# Altium footprint library ref-packages.PCBLIB: 1543 footprints (part 72 of 103) (continued)
## SQFP-R-10X14-140 [mm] (continued)
  rectangle: 6.95,0.68 8.1,0.82
  rectangle: 6.95,0.98 8.1,1.12
  rectangle: 6.95,1.28 8.1,1.42
  rectangle: 6.95,1.58 8.1,1.72
  rectangle: 6.95,1.88 8.1,2.02
  rectangle: 6.95,2.18 8.1,2.32
  rectangle: 6.95,2.48 8.1,2.62
  rectangle: 6.95,2.78 8.1,2.92
  rectangle: 6.95,3.08 8.1,3.22
  rectangle: 6.95,3.38 8.1,3.52
  rectangle: 6.95,3.68 8.1,3.82
  rectangle: 6.95,3.98 8.1,4.12
  rectangle: 6.08,4.95 6.22,6.1
  rectangle: 5.78,4.95 5.92,6.1
  rectangle: 5.48,4.95 5.62,6.1
  rectangle: 5.18,4.95 5.32,6.1
  rectangle: 4.88,4.95 5.02,6.1
  rectangle: 4.58,4.95 4.72,6.1
  rectangle: 4.28,4.95 4.42,6.1
  rectangle: 3.98,4.95 4.12,6.1
  rectangle: 3.68,4.95 3.82,6.1
  rectangle: 3.38,4.95 3.52,6.1
  rectangle: 3.08,4.95 3.22,6.1
  rectangle: 2.78,4.95 2.92,6.1
  rectangle: 2.48,4.95 2.62,6.1
  rectangle: 2.18,4.95 2.32,6.1
  rectangle: 1.88,4.95 2.02,6.1
  rectangle: 1.58,4.95 1.72,6.1
  rectangle: 1.28,4.95 1.42,6.1
  rectangle: 0.98,4.95 1.12,6.1
  rectangle: 0.68,4.95 0.82,6.1
  rectangle: 0.38,4.95 0.52,6.1
  rectangle: 0.08,4.95 0.22,6.1
  rectangle: -0.22,4.95 -0.08,6.1
  rectangle: -0.52,4.95 -0.38,6.1
  rectangle: -0.82,4.95 -0.68,6.1
  rectangle: -1.12,4.95 -0.98,6.1
  rectangle: -1.42,4.95 -1.28,6.1
  rectangle: -1.72,4.95 -1.58,6.1
  rectangle: -2.02,4.95 -1.88,6.1
  rectangle: -2.32,4.95 -2.18,6.1
  rectangle: -2.62,4.95 -2.48,6.1
  rectangle: -2.92,4.95 -2.78,6.1
  rectangle: -3.22,4.95 -3.08,6.1
  rectangle: -3.52,4.95 -3.38,6.1
  rectangle: -3.82,4.95 -3.68,6.1
  rectangle: -4.12,4.95 -3.98,6.1
  rectangle: -4.42,4.95 -4.28,6.1
  rectangle: -4.72,4.95 -4.58,6.1
  rectangle: -5.02,4.95 -4.88,6.1
  rectangle: -5.32,4.95 -5.18,6.1
  rectangle: -5.62,4.95 -5.48,6.1
  rectangle: -5.92,4.95 -5.78,6.1
  rectangle: -6.22,4.95 -6.08,6.1
  rectangle: -8.1,3.98 -6.95,4.12
  rectangle: -8.1,3.68 -6.95,3.82
  rectangle: -8.1,3.38 -6.95,3.52
  rectangle: -8.1,3.08 -6.95,3.22
  rectangle: -8.1,2.78 -6.95,2.92
  rectangle: -8.1,2.48 -6.95,2.62
  rectangle: -8.1,2.18 -6.95,2.32
  rectangle: -8.1,1.88 -6.95,2.02
  rectangle: -8.1,1.58 -6.95,1.72
  rectangle: -8.1,1.28 -6.95,1.42
  rectangle: -8.1,0.98 -6.95,1.12
  rectangle: -8.1,0.68 -6.95,0.82
  rectangle: -8.1,0.38 -6.95,0.52
  rectangle: -8.1,0.08 -6.95,0.22
  rectangle: -8.1,-0.22 -6.95,-0.08
  rectangle: -8.1,-0.52 -6.95,-0.38
  rectangle: -8.1,-0.82 -6.95,-0.68
  rectangle: -8.1,-1.12 -6.95,-0.98
  rectangle: -8.1,-1.42 -6.95,-1.28
  rectangle: -8.1,-1.72 -6.95,-1.58
  rectangle: -8.1,-2.02 -6.95,-1.88
  rectangle: -8.1,-2.32 -6.95,-2.18
  rectangle: -8.1,-2.62 -6.95,-2.48
  rectangle: -8.1,-2.92 -6.95,-2.78
  rectangle: -8.1,-3.22 -6.95,-3.08
  rectangle: -8.1,-3.52 -6.95,-3.38
  rectangle: -8.1,-3.82 -6.95,-3.68
  rectangle: -8.1,-4.12 -6.95,-3.98
  lines w0.203: -6.9,-4.9 6.9,-4.9 6.9,4.9 -6.9,4.9 -6.9,-4.9
Mechanical 27:
  lines w0.2: -8.9,-6.9 -8.9,6.9 8.9,6.9 8.9,-6.9 -8.9,-6.9

## SQFP-R-10X14-148 [mm]
pads (148):
  rect 0.17x1.6 smd: 1(-6.45,-5.6) 2(-6.15,-5.6) 3(-5.85,-5.6) 4(-5.55,-5.6) 5(-5.25,-5.6) 6(-4.95,-5.6) 7(-4.65,-5.6) 8(-4.35,-5.6) 9(-4.05,-5.6) 10(-3.75,-5.6) 11(-3.45,-5.6) 12(-3.15,-5.6) 13(-2.85,-5.6) 14(-2.55,-5.6) 15(-2.25,-5.6) 16(-1.95,-5.6) 17(-1.65,-5.6) 18(-1.35,-5.6) 19(-1.05,-5.6) 20(-0.75,-5.6) 21(-0.45,-5.6) 22(-0.15,-5.6) 23(0.15,-5.6) 24(0.45,-5.6) 25(0.75,-5.6) 26(1.05,-5.6) 27(1.35,-5.6) 28(1.65,-5.6) 29(1.95,-5.6) 30(2.25,-5.6) 31(2.55,-5.6) 32(2.85,-5.6) 33(3.15,-5.6) 34(3.45,-5.6) 35(3.75,-5.6) 36(4.05,-5.6) 37(4.35,-5.6) 38(4.65,-5.6) 39(4.95,-5.6) 40(5.25,-5.6) 41(5.55,-5.6) 42(5.85,-5.6) 43(6.15,-5.6) 44(6.45,-5.6) 75(6.45,5.6) 76(6.15,5.6) 77(5.85,5.6) 78(5.55,5.6) 79(5.25,5.6) 80(4.95,5.6) 81(4.65,5.6) 82(4.35,5.6) 83(4.05,5.6) 84(3.75,5.6) 85(3.45,5.6) 86(3.15,5.6) 87(2.85,5.6) 88(2.55,5.6) 89(2.25,5.6) 90(1.95,5.6) 91(1.65,5.6) 92(1.35,5.6) 93(1.05,5.6) 94(0.75,5.6) 95(0.45,5.6) 96(0.15,5.6) 97(-0.15,5.6) 98(-0.45,5.6) 99(-0.75,5.6) 100(-1.05,5.6) 101(-1.35,5.6) 102(-1.65,5.6) 103(-1.95,5.6) 104(-2.25,5.6) 105(-2.55,5.6) 106(-2.85,5.6) 107(-3.15,5.6) 108(-3.45,5.6) 109(-3.75,5.6) 110(-4.05,5.6) 111(-4.35,5.6) 112(-4.65,5.6) 113(-4.95,5.6) 114(-5.25,5.6) 115(-5.55,5.6) 116(-5.85,5.6) 117(-6.15,5.6) 118(-6.45,5.6)
  rect 1.6x0.17 smd: 45(7.6,-4.35) 46(7.6,-4.05) 47(7.6,-3.75) 48(7.6,-3.45) 49(7.6,-3.15) 50(7.6,-2.85) 51(7.6,-2.55) 52(7.6,-2.25) 53(7.6,-1.95) 54(7.6,-1.65) 55(7.6,-1.35) 56(7.6,-1.05) 57(7.6,-0.75) 58(7.6,-0.45) 59(7.6,-0.15) 60(7.6,0.15) 61(7.6,0.45) 62(7.6,0.75) 63(7.6,1.05) 64(7.6,1.35) 65(7.6,1.65) 66(7.6,1.95) 67(7.6,2.25) 68(7.6,2.55) 69(7.6,2.85) 70(7.6,3.15) 71(7.6,3.45) 72(7.6,3.75) 73(7.6,4.05) 74(7.6,4.35) 119(-7.6,4.35) 120(-7.6,4.05) 121(-7.6,3.75) 122(-7.6,3.45) 123(-7.6,3.15) 124(-7.6,2.85) 125(-7.6,2.55) 126(-7.6,2.25) 127(-7.6,1.95) 128(-7.6,1.65) 129(-7.6,1.35) 130(-7.6,1.05) 131(-7.6,0.75) 132(-7.6,0.45) 133(-7.6,0.15) 134(-7.6,-0.15) 135(-7.6,-0.45) 136(-7.6,-0.75) 137(-7.6,-1.05) 138(-7.6,-1.35) 139(-7.6,-1.65) 140(-7.6,-1.95) 141(-7.6,-2.25) 142(-7.6,-2.55) 143(-7.6,-2.85) 144(-7.6,-3.15) 145(-7.6,-3.45) 146(-7.6,-3.75) 147(-7.6,-4.05) 148(-7.6,-4.35)
Top Overlay:
  circle w0.254: c-5.5,-3.5 r0.75
  lines w0.203: -6.57,-4.56 6.56,-4.56 6.56,4.56 -6.57,4.56 -6.57,-4.56
Mechanical 16:
  drawing of 152 lines, arcs and shapes, not listed
Mechanical 27:
  lines w0.2: -8.9,-6.9 -8.9,6.9 8.9,6.9 8.9,-6.9 -8.9,-6.9

## SQFP-R-14X20-80 [mm]
pads (80):
  rect 0.5x1.8 smd: 1(-9.2,-8.1) 2(-8.4,-8.1) 3(-7.6,-8.1) 4(-6.8,-8.1) 5(-6,-8.1) 6(-5.2,-8.1) 7(-4.4,-8.1) 8(-3.6,-8.1) 9(-2.8,-8.1) 10(-2,-8.1) 11(-1.2,-8.1) 12(-0.4,-8.1) 13(0.4,-8.1) 14(1.2,-8.1) 15(2,-8.1) 16(2.8,-8.1) 17(3.6,-8.1) 18(4.4,-8.1) 19(5.2,-8.1) 20(6,-8.1) 21(6.8,-8.1) 22(7.6,-8.1) 23(8.4,-8.1) 24(9.2,-8.1) 41(9.2,8.1) 42(8.4,8.1) 43(7.6,8.1) 44(6.8,8.1) 45(6,8.1) 46(5.2,8.1) 47(4.4,8.1) 48(3.6,8.1) 49(2.8,8.1) 50(2,8.1) 51(1.2,8.1) 52(0.4,8.1) 53(-0.4,8.1) 54(-1.2,8.1) 55(-2,8.1) 56(-2.8,8.1) 57(-3.6,8.1) 58(-4.4,8.1) 59(-5.2,8.1) 60(-6,8.1) 61(-6.8,8.1) 62(-7.6,8.1) 63(-8.4,8.1) 64(-9.2,8.1)
  rect 1.8x0.5 smd: 25(11.1,-6) 26(11.1,-5.2) 27(11.1,-4.4) 28(11.1,-3.6) 29(11.1,-2.8) 30(11.1,-2) 31(11.1,-1.2) 32(11.1,-0.4) 33(11.1,0.4) 34(11.1,1.2) 35(11.1,2) 36(11.1,2.8) 37(11.1,3.6) 38(11.1,4.4) 39(11.1,5.2) 40(11.1,6) 65(-11.1,6) 66(-11.1,5.2) 67(-11.1,4.4) 68(-11.1,3.6) 69(-11.1,2.8) 70(-11.1,2) 71(-11.1,1.2) 72(-11.1,0.4) 73(-11.1,-0.4) 74(-11.1,-1.2) 75(-11.1,-2) 76(-11.1,-2.8) 77(-11.1,-3.6) 78(-11.1,-4.4) 79(-11.1,-5.2) 80(-11.1,-6)
Top Overlay:
  circle w0.254: c-8.25,-5.5 r0.75
  lines w0.203: -9.57,-6.56 9.56,-6.56 9.56,6.56 -9.57,6.56 -9.57,-6.56
Mechanical 16:
  rectangle: -9.42,-8.72 -8.98,-6.95
  rectangle: 9.95,-6.22 11.72,-5.78
  rectangle: -8.62,-8.72 -8.18,-6.95
  rectangle: -7.82,-8.72 -7.38,-6.95
  rectangle: -7.02,-8.72 -6.58,-6.95
  rectangle: -6.22,-8.72 -5.78,-6.95
  rectangle: -5.42,-8.72 -4.98,-6.95
  rectangle: -4.62,-8.72 -4.18,-6.95
  rectangle: -3.82,-8.72 -3.38,-6.95
  rectangle: -3.02,-8.72 -2.58,-6.95
  rectangle: -2.22,-8.72 -1.78,-6.95
  rectangle: -1.42,-8.72 -0.98,-6.95
  rectangle: -0.62,-8.72 -0.18,-6.95
  rectangle: 0.18,-8.72 0.62,-6.95
  rectangle: 0.98,-8.72 1.42,-6.95
  rectangle: 1.78,-8.72 2.22,-6.95
  rectangle: 2.58,-8.72 3.02,-6.95
  rectangle: 3.38,-8.72 3.82,-6.95
  rectangle: 4.18,-8.72 4.62,-6.95
  rectangle: 4.98,-8.72 5.42,-6.95
  rectangle: 5.78,-8.72 6.22,-6.95
  rectangle: 6.58,-8.72 7.02,-6.95
  rectangle: 7.38,-8.72 7.82,-6.95
  rectangle: 8.18,-8.72 8.62,-6.95
  rectangle: 8.98,-8.72 9.42,-6.95
  rectangle: 9.95,-5.42 11.72,-4.98
  rectangle: 9.95,-4.62 11.72,-4.18
  rectangle: 9.95,-3.82 11.72,-3.38
  rectangle: 9.95,-3.02 11.72,-2.58
  rectangle: 9.95,-2.22 11.72,-1.78
  rectangle: 9.95,-1.42 11.72,-0.98
  rectangle: 9.95,-0.62 11.72,-0.18
  rectangle: 9.95,0.18 11.72,0.62
  rectangle: 9.95,0.98 11.72,1.42
  rectangle: 9.95,1.78 11.72,2.22
  rectangle: 9.95,2.58 11.72,3.02
  rectangle: 9.95,3.38 11.72,3.82
  rectangle: 9.95,4.18 11.72,4.62
  rectangle: 9.95,4.98 11.72,5.42
  rectangle: 9.95,5.78 11.72,6.22
  rectangle: 8.98,6.95 9.42,8.72
  rectangle: 8.18,6.95 8.62,8.72
  rectangle: 7.38,6.95 7.82,8.72
  rectangle: 6.58,6.95 7.02,8.72
  rectangle: 5.78,6.95 6.22,8.72
  rectangle: 4.98,6.95 5.42,8.72
  rectangle: 4.18,6.95 4.62,8.72
  rectangle: 3.38,6.95 3.82,8.72
  rectangle: 2.58,6.95 3.02,8.72
  rectangle: 1.78,6.95 2.22,8.72
  rectangle: 0.98,6.95 1.42,8.72
  rectangle: 0.18,6.95 0.62,8.72
  rectangle: -0.62,6.95 -0.18,8.72
  rectangle: -1.42,6.95 -0.98,8.72
  rectangle: -2.22,6.95 -1.78,8.72
  rectangle: -3.02,6.95 -2.58,8.72
  rectangle: -3.82,6.95 -3.38,8.72
  rectangle: -4.62,6.95 -4.18,8.72
  rectangle: -5.42,6.95 -4.98,8.72
  rectangle: -6.22,6.95 -5.78,8.72
  rectangle: -7.02,6.95 -6.58,8.72
  rectangle: -7.82,6.95 -7.38,8.72
  rectangle: -8.62,6.95 -8.18,8.72
  rectangle: -9.42,6.95 -8.98,8.72
  rectangle: -11.72,5.78 -9.95,6.22
  rectangle: -11.72,4.98 -9.95,5.42
  rectangle: -11.72,4.18 -9.95,4.62
  rectangle: -11.72,3.38 -9.95,3.82
  rectangle: -11.72,2.58 -9.95,3.02
  rectangle: -11.72,1.78 -9.95,2.22
  rectangle: -11.72,0.98 -9.95,1.42
  rectangle: -11.72,0.18 -9.95,0.62
  rectangle: -11.72,-0.62 -9.95,-0.18
  rectangle: -11.72,-1.42 -9.95,-0.98
  rectangle: -11.72,-2.22 -9.95,-1.78
  rectangle: -11.72,-3.02 -9.95,-2.58
  rectangle: -11.72,-3.82 -9.95,-3.38
  rectangle: -11.72,-4.62 -9.95,-4.18
  rectangle: -11.72,-5.42 -9.95,-4.98
  rectangle: -11.72,-6.22 -9.95,-5.78
  lines w0.203: -9.9,-6.9 9.9,-6.9 9.9,6.9 -9.9,6.9 -9.9,-6.9
Mechanical 27:
  lines w0.2: -12.4,-9.4 -12.4,9.4 12.4,9.4 12.4,-9.4 -12.4,-9.4

## SQFP-R-14X20-100 [mm]
pads (100):
  rect 0.4x1.8 smd: 1(-9.425,-8.1) 2(-8.775,-8.1) 3(-8.125,-8.1) 4(-7.475,-8.1) 5(-6.825,-8.1) 6(-6.175,-8.1) 7(-5.525,-8.1) 8(-4.875,-8.1) 9(-4.225,-8.1) 10(-3.575,-8.1) 11(-2.925,-8.1) 12(-2.275,-8.1) 13(-1.625,-8.1) 14(-0.975,-8.1) 15(-0.325,-8.1) 16(0.325,-8.1) 17(0.975,-8.1) 18(1.625,-8.1) 19(2.275,-8.1) 20(2.925,-8.1) 21(3.575,-8.1) 22(4.225,-8.1) 23(4.875,-8.1) 24(5.525,-8.1) 25(6.175,-8.1) 26(6.825,-8.1) 27(7.475,-8.1) 28(8.125,-8.1) 29(8.775,-8.1) 30(9.425,-8.1) 51(9.425,8.1) 52(8.775,8.1) 53(8.125,8.1) 54(7.475,8.1) 55(6.825,8.1) 56(6.175,8.1) 57(5.525,8.1) 58(4.875,8.1) 59(4.225,8.1) 60(3.575,8.1) 61(2.925,8.1) 62(2.275,8.1) 63(1.625,8.1) 64(0.975,8.1) 65(0.325,8.1) 66(-0.325,8.1) 67(-0.975,8.1) 68(-1.625,8.1) 69(-2.275,8.1) 70(-2.925,8.1) 71(-3.575,8.1) 72(-4.225,8.1) 73(-4.875,8.1) 74(-5.525,8.1) 75(-6.175,8.1) 76(-6.825,8.1) 77(-7.475,8.1) 78(-8.125,8.1) 79(-8.775,8.1) 80(-9.425,8.1)
  rect 1.8x0.4 smd: 31(11.1,-6.175) 32(11.1,-5.525) 33(11.1,-4.875) 34(11.1,-4.225) 35(11.1,-3.575) 36(11.1,-2.925) 37(11.1,-2.275) 38(11.1,-1.625) 39(11.1,-0.975) 40(11.1,-0.325) 41(11.1,0.325) 42(11.1,0.975) 43(11.1,1.625) 44(11.1,2.275) 45(11.1,2.925) 46(11.1,3.575) 47(11.1,4.225) 48(11.1,4.875) 49(11.1,5.525) 50(11.1,6.175) 81(-11.1,6.175) 82(-11.1,5.525) 83(-11.1,4.875) 84(-11.1,4.225) 85(-11.1,3.575) 86(-11.1,2.925) 87(-11.1,2.275) 88(-11.1,1.625) 89(-11.1,0.975) 90(-11.1,0.325) 91(-11.1,-0.325) 92(-11.1,-0.975) 93(-11.1,-1.625) 94(-11.1,-2.275) 95(-11.1,-2.925) 96(-11.1,-3.575) 97(-11.1,-4.225) 98(-11.1,-4.875) 99(-11.1,-5.525) 100(-11.1,-6.175)
Top Overlay:
  circle w0.254: c-8.65,-5.5 r0.75
  lines w0.203: -9.57,-6.56 9.56,-6.56 9.56,6.56 -9.57,6.56 -9.57,-6.56
Mechanical 16:
  rectangle: -9.615,-8.72 -9.235,-6.95
  rectangle: 9.95,-6.365 11.72,-5.985
  rectangle: -8.965,-8.72 -8.585,-6.95
  rectangle: -8.315,-8.72 -7.935,-6.95
  rectangle: -7.665,-8.72 -7.285,-6.95
  rectangle: -7.015,-8.72 -6.635,-6.95
  rectangle: -6.365,-8.72 -5.985,-6.95
  rectangle: -5.715,-8.72 -5.335,-6.95
  rectangle: -5.065,-8.72 -4.685,-6.95
  rectangle: -4.415,-8.72 -4.035,-6.95
  rectangle: -3.765,-8.72 -3.385,-6.95
  rectangle: -3.115,-8.72 -2.735,-6.95
  rectangle: -2.465,-8.72 -2.085,-6.95
  rectangle: -1.815,-8.72 -1.435,-6.95
  rectangle: -1.165,-8.72 -0.785,-6.95
  rectangle: -0.515,-8.72 -0.135,-6.95
  rectangle: 0.135,-8.72 0.515,-6.95
  rectangle: 0.785,-8.72 1.165,-6.95
  rectangle: 1.435,-8.72 1.815,-6.95
  rectangle: 2.085,-8.72 2.465,-6.95
  rectangle: 2.735,-8.72 3.115,-6.95
  rectangle: 3.385,-8.72 3.765,-6.95
  rectangle: 4.035,-8.72 4.415,-6.95
  rectangle: 4.685,-8.72 5.065,-6.95
  rectangle: 5.335,-8.72 5.715,-6.95
  rectangle: 5.985,-8.72 6.365,-6.95
  rectangle: 6.635,-8.72 7.015,-6.95
  rectangle: 7.285,-8.72 7.665,-6.95
  rectangle: 7.935,-8.72 8.315,-6.95
  rectangle: 8.585,-8.72 8.965,-6.95
  rectangle: 9.235,-8.72 9.615,-6.95
  rectangle: 9.95,-5.715 11.72,-5.335
  rectangle: 9.95,-5.065 11.72,-4.685
  rectangle: 9.95,-4.415 11.72,-4.035
  rectangle: 9.95,-3.765 11.72,-3.385
  rectangle: 9.95,-3.115 11.72,-2.735
  rectangle: 9.95,-2.465 11.72,-2.085
  rectangle: 9.95,-1.815 11.72,-1.435
  rectangle: 9.95,-1.165 11.72,-0.785
  rectangle: 9.95,-0.515 11.72,-0.135
  rectangle: 9.95,0.135 11.72,0.515
  rectangle: 9.95,0.785 11.72,1.165
  rectangle: 9.95,1.435 11.72,1.815
  rectangle: 9.95,2.085 11.72,2.465
  rectangle: 9.95,2.735 11.72,3.115
  rectangle: 9.95,3.385 11.72,3.765
  rectangle: 9.95,4.035 11.72,4.415
  rectangle: 9.95,4.685 11.72,5.065
  rectangle: 9.95,5.335 11.72,5.715
  rectangle: 9.95,5.985 11.72,6.365
  rectangle: 9.235,6.95 9.615,8.72
  rectangle: 8.585,6.95 8.965,8.72
  rectangle: 7.935,6.95 8.315,8.72
  rectangle: 7.285,6.95 7.665,8.72
  rectangle: 6.635,6.95 7.015,8.72
  rectangle: 5.985,6.95 6.365,8.72
  rectangle: 5.335,6.95 5.715,8.72
  rectangle: 4.685,6.95 5.065,8.72
  rectangle: 4.035,6.95 4.415,8.72
  rectangle: 3.385,6.95 3.765,8.72
  rectangle: 2.735,6.95 3.115,8.72
  rectangle: 2.085,6.95 2.465,8.72
  rectangle: 1.435,6.95 1.815,8.72
  rectangle: 0.785,6.95 1.165,8.72
  rectangle: 0.135,6.95 0.515,8.72
  rectangle: -0.515,6.95 -0.135,8.72
  rectangle: -1.165,6.95 -0.785,8.72
  rectangle: -1.815,6.95 -1.435,8.72
  rectangle: -2.465,6.95 -2.085,8.72
  rectangle: -3.115,6.95 -2.735,8.72
  rectangle: -3.765,6.95 -3.385,8.72
  rectangle: -4.415,6.95 -4.035,8.72
  rectangle: -5.065,6.95 -4.685,8.72
  rectangle: -5.715,6.95 -5.335,8.72
  rectangle: -6.365,6.95 -5.985,8.72
  rectangle: -7.015,6.95 -6.635,8.72
  rectangle: -7.665,6.95 -7.285,8.72
  rectangle: -8.315,6.95 -7.935,8.72
  rectangle: -8.965,6.95 -8.585,8.72
  rectangle: -9.615,6.95 -9.235,8.72
  rectangle: -11.72,5.985 -9.95,6.365
  rectangle: -11.72,5.335 -9.95,5.715
  rectangle: -11.72,4.685 -9.95,5.065
  rectangle: -11.72,4.035 -9.95,4.415
  rectangle: -11.72,3.385 -9.95,3.765
  rectangle: -11.72,2.735 -9.95,3.115
  rectangle: -11.72,2.085 -9.95,2.465
  rectangle: -11.72,1.435 -9.95,1.815
  rectangle: -11.72,0.785 -9.95,1.165
  rectangle: -11.72,0.135 -9.95,0.515
  rectangle: -11.72,-0.515 -9.95,-0.135
  rectangle: -11.72,-1.165 -9.95,-0.785
  rectangle: -11.72,-1.815 -9.95,-1.435
  rectangle: -11.72,-2.465 -9.95,-2.085
  rectangle: -11.72,-3.115 -9.95,-2.735
  rectangle: -11.72,-3.765 -9.95,-3.385
  rectangle: -11.72,-4.415 -9.95,-4.035
  rectangle: -11.72,-5.065 -9.95,-4.685
  rectangle: -11.72,-5.715 -9.95,-5.335
  rectangle: -11.72,-6.365 -9.95,-5.985
  lines w0.203: -9.9,-6.9 9.9,-6.9 9.9,6.9 -9.9,6.9 -9.9,-6.9
Mechanical 27:
  lines w0.2: -12.4,-9.4 -12.4,9.4 12.4,9.4 12.4,-9.4 -12.4,-9.4

## SQFP-R-14X20-120 [mil]
pads (120):
  rect 11.81x62.99 smd: 1(-344.49,-299.21) 2(-324.8,-299.21) 3(-305.12,-299.21) 4(-285.43,-299.21) 5(-265.75,-299.21) 6(-246.06,-299.21) 7(-226.38,-299.21) 8(-206.69,-299.21) 9(-187.01,-299.21) 10(-167.32,-299.21) 11(-147.64,-299.21) 12(-127.95,-299.21) 13(-108.27,-299.21) 14(-88.58,-299.21) 15(-68.9,-299.21) 16(-49.21,-299.21) 17(-29.53,-299.21) 18(-9.84,-299.21) 19(9.84,-299.21) 20(29.53,-299.21) 21(49.21,-299.21) 22(68.9,-299.21) 23(88.58,-299.21) 24(108.27,-299.21) 25(127.95,-299.21) 26(147.64,-299.21) 27(167.32,-299.21) 28(187.01,-299.21) 29(206.69,-299.21) 30(226.38,-299.21) 31(246.06,-299.21) 32(265.75,-299.21) 33(285.43,-299.21) 34(305.12,-299.21) 35(324.8,-299.21) 36(344.49,-299.21) 61(344.49,299.21) 62(324.8,299.21) 63(305.12,299.21) 64(285.43,299.21) 65(265.75,299.21) 66(246.06,299.21) 67(226.38,299.21) 68(206.69,299.21) 69(187.01,299.21) 70(167.32,299.21) 71(147.64,299.21) 72(127.95,299.21) 73(108.27,299.21) 74(88.58,299.21) 75(68.9,299.21) 76(49.21,299.21) 77(29.53,299.21) 78(9.84,299.21) 79(-9.84,299.21) 80(-29.53,299.21) 81(-49.21,299.21) 82(-68.9,299.21) 83(-88.58,299.21) 84(-108.27,299.21) 85(-127.95,299.21) 86(-147.64,299.21) 87(-167.32,299.21) 88(-187.01,299.21) 89(-206.69,299.21) 90(-226.38,299.21) 91(-246.06,299.21) 92(-265.75,299.21) 93(-285.43,299.21) 94(-305.12,299.21) 95(-324.8,299.21) 96(-344.49,299.21)
  rect 62.99x11.81 smd: 37(417.32,-226.38) 38(417.32,-206.69) 39(417.32,-187.01) 40(417.32,-167.32) 41(417.32,-147.64) 42(417.32,-127.95) 43(417.32,-108.27) 44(417.32,-88.58) 45(417.32,-68.9) 46(417.32,-49.21) 47(417.32,-29.53) 48(417.32,-9.84) 49(417.32,9.84) 50(417.32,29.53) 51(417.32,49.21) 52(417.32,68.9) 53(417.32,88.58) 54(417.32,108.27) 55(417.32,127.95) 56(417.32,147.64) 57(417.32,167.32) 58(417.32,187.01) 59(417.32,206.69) 60(417.32,226.38) 97(-417.32,226.38) 98(-417.32,206.69) 99(-417.32,187.01) 100(-417.32,167.32) 101(-417.32,147.64) 102(-417.32,127.95) 103(-417.32,108.27) 104(-417.32,88.58) 105(-417.32,68.9) 106(-417.32,49.21) 107(-417.32,29.53) 108(-417.32,9.84) 109(-417.32,-9.84) 110(-417.32,-29.53) 111(-417.32,-49.21) 112(-417.32,-68.9) 113(-417.32,-88.58) 114(-417.32,-108.27) 115(-417.32,-127.95) 116(-417.32,-147.64) 117(-417.32,-167.32) 118(-417.32,-187.01) 119(-417.32,-206.69) 120(-417.32,-226.38)
Top Overlay:
  circle w10: c-336.61,-212.6 r29.52
  lines w8: -376.77,-258.27 376.38,-258.27 376.38,258.27 -376.77,258.27 -376.77,-258.27
Mechanical 16:
  rectangle: -350.39,-323.62 -338.58,-273.62
  rectangle: -330.71,-323.62 -318.9,-273.62
  rectangle: -311.02,-323.62 -299.21,-273.62
  rectangle: -291.34,-323.62 -279.53,-273.62
  rectangle: -271.65,-323.62 -259.84,-273.62
  rectangle: -251.97,-323.62 -240.16,-273.62
  rectangle: -232.28,-323.62 -220.47,-273.62
  rectangle: -212.6,-323.62 -200.79,-273.62
  rectangle: -192.91,-323.62 -181.1,-273.62
  rectangle: -173.23,-323.62 -161.42,-273.62
  rectangle: -153.54,-323.62 -141.73,-273.62
  rectangle: -133.86,-323.62 -122.05,-273.62
  rectangle: -114.17,-323.62 -102.36,-273.62
  rectangle: -94.49,-323.62 -82.68,-273.62
  rectangle: -74.8,-323.62 -62.99,-273.62
  rectangle: -55.12,-323.62 -43.31,-273.62
  rectangle: -35.43,-323.62 -23.62,-273.62
  rectangle: -15.75,-323.62 -3.94,-273.62
  rectangle: 3.94,-323.62 15.75,-273.62
  rectangle: 23.62,-323.62 35.43,-273.62
  rectangle: 43.31,-323.62 55.12,-273.62
  rectangle: 62.99,-323.62 74.8,-273.62
  rectangle: 82.68,-323.62 94.49,-273.62
  rectangle: 102.36,-323.62 114.17,-273.62
  rectangle: 122.05,-323.62 133.86,-273.62
  rectangle: 141.73,-323.62 153.54,-273.62
  rectangle: 161.42,-323.62 173.23,-273.62
  rectangle: 181.1,-323.62 192.91,-273.62
  rectangle: 200.79,-323.62 212.6,-273.62
  rectangle: 220.47,-323.62 232.28,-273.62
  rectangle: 240.16,-323.62 251.97,-273.62
  rectangle: 259.84,-323.62 271.65,-273.62
  rectangle: 279.53,-323.62 291.34,-273.62
  rectangle: 299.21,-323.62 311.02,-273.62
  rectangle: 318.9,-323.62 330.71,-273.62
  rectangle: 338.58,-323.62 350.39,-273.62
  rectangle: 391.73,-232.28 441.73,-220.47
  rectangle: 391.73,-212.6 441.73,-200.79
  rectangle: 391.73,-192.91 441.73,-181.1
  rectangle: 391.73,-173.23 441.73,-161.42
  rectangle: 391.73,-153.54 441.73,-141.73
  rectangle: 391.73,-133.86 441.73,-122.05
  rectangle: 391.73,-114.17 441.73,-102.36
  rectangle: 391.73,-94.49 441.73,-82.68
  rectangle: 391.73,-74.8 441.73,-62.99
  rectangle: 391.73,-55.12 441.73,-43.31
  rectangle: 391.73,-35.43 441.73,-23.62
  rectangle: 391.73,-15.75 441.73,-3.94
  rectangle: 391.73,3.94 441.73,15.75
  rectangle: 391.73,23.62 441.73,35.43
  rectangle: 391.73,43.31 441.73,55.12
  rectangle: 391.73,62.99 441.73,74.8
  rectangle: 391.73,82.68 441.73,94.49
  rectangle: 391.73,102.36 441.73,114.17
  rectangle: 391.73,122.05 441.73,133.86
  rectangle: 391.73,141.73 441.73,153.54
  rectangle: 391.73,161.42 441.73,173.23
  rectangle: 391.73,181.1 441.73,192.91
  rectangle: 391.73,200.79 441.73,212.6
  rectangle: 391.73,220.47 441.73,232.28
  rectangle: 338.58,273.62 350.39,323.62
  rectangle: 318.9,273.62 330.71,323.62
  rectangle: 299.21,273.62 311.02,323.62
  rectangle: 279.53,273.62 291.34,323.62
  rectangle: 259.84,273.62 271.65,323.62
  rectangle: 240.16,273.62 251.97,323.62
  rectangle: 220.47,273.62 232.28,323.62
  rectangle: 200.79,273.62 212.6,323.62
  rectangle: 181.1,273.62 192.91,323.62
  rectangle: 161.42,273.62 173.23,323.62
  rectangle: 141.73,273.62 153.54,323.62
  rectangle: 122.05,273.62 133.86,323.62
  rectangle: 102.36,273.62 114.17,323.62
  rectangle: 82.68,273.62 94.49,323.62
  rectangle: 62.99,273.62 74.8,323.62
  rectangle: 43.31,273.62 55.12,323.62
  rectangle: 23.62,273.62 35.43,323.62
  rectangle: 3.94,273.62 15.75,323.62
  rectangle: -15.75,273.62 -3.94,323.62
  rectangle: -35.43,273.62 -23.62,323.62
  rectangle: -55.12,273.62 -43.31,323.62
  rectangle: -74.8,273.62 -62.99,323.62
  rectangle: -94.49,273.62 -82.68,323.62
  rectangle: -114.17,273.62 -102.36,323.62
  rectangle: -133.86,273.62 -122.05,323.62
  rectangle: -153.54,273.62 -141.73,323.62
  rectangle: -173.23,273.62 -161.42,323.62
  rectangle: -192.91,273.62 -181.1,323.62
  rectangle: -212.6,273.62 -200.79,323.62
  rectangle: -232.28,273.62 -220.47,323.62
  rectangle: -251.97,273.62 -240.16,323.62
  rectangle: -271.65,273.62 -259.84,323.62
  rectangle: -291.34,273.62 -279.53,323.62
  rectangle: -311.02,273.62 -299.21,323.62
  rectangle: -330.71,273.62 -318.9,323.62
  rectangle: -350.39,273.62 -338.58,323.62
  rectangle: -441.73,220.47 -391.73,232.28
  rectangle: -441.73,200.79 -391.73,212.6
  rectangle: -441.73,181.1 -391.73,192.91
  rectangle: -441.73,161.42 -391.73,173.23
  rectangle: -441.73,141.73 -391.73,153.54
  rectangle: -441.73,122.05 -391.73,133.86
  rectangle: -441.73,102.36 -391.73,114.17
  rectangle: -441.73,82.68 -391.73,94.49
  rectangle: -441.73,62.99 -391.73,74.8
  rectangle: -441.73,43.31 -391.73,55.12
  rectangle: -441.73,23.62 -391.73,35.43
  rectangle: -441.73,3.94 -391.73,15.75
  rectangle: -441.73,-15.75 -391.73,-3.94
  rectangle: -441.73,-35.43 -391.73,-23.62
  rectangle: -441.73,-55.12 -391.73,-43.31
  rectangle: -441.73,-74.8 -391.73,-62.99
  rectangle: -441.73,-94.49 -391.73,-82.68
  rectangle: -441.73,-114.17 -391.73,-102.36
  rectangle: -441.73,-133.86 -391.73,-122.05
  rectangle: -441.73,-153.54 -391.73,-141.73
  rectangle: -441.73,-173.23 -391.73,-161.42
  rectangle: -441.73,-192.91 -391.73,-181.1
  rectangle: -441.73,-212.6 -391.73,-200.79
  rectangle: -441.73,-232.28 -391.73,-220.47
  lines w8: -389.76,-271.65 389.76,-271.65 389.76,271.65 -389.76,271.65 -389.76,-271.65
Mechanical 27:
  lines w7.87: -468.5,-350.39 -468.5,350.39 468.5,350.39 468.5,-350.39 -468.5,-350.39